# Altium schematic symbol library BARKO_SCHLIB.SchLib: 1064 symbols (part 1 of 11) (continued)
## C-10NF-0603_1 (continued)
CAP CER 10000PF 50V X5R 0603; Manufacturer: TDK; Manufacturer Part Number: CGA3E2X5R1H103M080AA; Tolerance: 20%; Material: Ceramic; Insulation Resistance: 100GR; .PCBCHK: USED; .Creator: M.OZKAN; Washability: OK; Stock 1: 10; Pricing 1: 1=0.1, 10=0.046, 100=0.0203, 500=0.0145, 1000=0.01139 (USD); Mount: Surface Mount; Case/Package: 0603; Weight: 7.1E-05oz; Case Code (Metric): 1608; Min Operating Temperature: -55°C; Max Operating Temperature: 85°C; Package Quantity: 4000; Packaging: Tape and Reel; Capacitance: 10nF; Dielectric: X5R; Termination: SMD/SMT; Voltage Rating (DC): 50V; Length: 0.063inch; Height: 0.8mm; Width: 0.031inch; Thickness: 0.035inch; Ratings: AEC-Q200; Voltage: 50V; Depth: 1.25mm; Radiation Hardening: No; Lead Free: Lead Free; ComponentLink1URL: http://www.samsungsem.com/kr/front/downloadcms.do?path=/kr/support/product-search/mlcc/__icsFiles/afieldfile/2014/11/05&fileName=C_CL21B103KBANNNL.pdf; ComponentLink1Description: http://www.samsungsem.com/kr/front/downloadcms.do?path=/kr/support/product-search/mlcc/__icsFiles/afieldfile/2014/11/05&fileName=C_CL21B103KBANNNL.pdf; ComponentLink2URL: https://www.verical.com/server-webapp/html/getDatasheet?partID=354069; ComponentLink2Description: https://www.verical.com/server-webapp/html/getDatasheet?partID=354069; Number of Pins: 2; Composition: Ceramic; REACH SVHC: No SVHC; Halogen Free: Halogen Free; ComponentLink3URL: http://www.yageo.com/documents/recent/UPY-GPHC_X7R_6.3V-to-50V_18.pdf; ComponentLink3Description: http://www.yageo.com/documents/recent/UPY-GPHC_X7R_6.3V-to-50V_18.pdf; ComponentLink4URL: http://www.yageo.com/documents/recent/UPY-GPHC_X7R_6.3V-to-50V_8.pdf; ComponentLink4Description: http://www.yageo.com/documents/recent/UPY-GPHC_X7R_6.3V-to-50V_8.pdf; ComponentLink5URL: http://www.farnell.com/datasheets/1784427.pdf; ComponentLink5Description: http://www.farnell.com/datasheets/1784427.pdf; ComponentLink6URL: http://www.farnell.com/datasheets/1489800.pdf; ComponentLink6Description: http://www.farnell.com/datasheets/1489800.pdf; ComponentLink7URL: http://www.farnell.com/datasheets/1734573.pdf; ComponentLink7Description: http://www.farnell.com/datasheets/1734573.pdf; .SCHCHK: USED; Stock 2: 0; Dielectric Material: Ceramic; ComponentLink8URL: http://psearch.murata.com/capacitor/product/GRM188R61H103KA01%23.pdf?src-supplier=Avnet; ComponentLink8Description: http://psearch.murata.com/capacitor/product/GRM188R61H103KA01%23.pdf?src-supplier=Avnet; ComponentLink9URL: http://psearch.murata.com/capacitor/product/GRM188R61H103KA01%23.pdf?src-supplier=Avnet+Europe; ComponentLink9Description: http://psearch.murata.com/capacitor/product/GRM188R61H103KA01%23.pdf?src-supplier=Avnet+Europe; ComponentLink10URL: http://search.murata.co.jp/Ceramy/image/img/A01X/partnumbering_e_01.pdf?src-supplier=Digi-Key; ComponentLink10Description: http://search.murata.co.jp/Ceramy/image/img/A01X/partnumbering_e_01.pdf?src-supplier=Digi-Key; Supplier 1: Digi-Key; Supplier Part Number 1: 445-12487-6-ND
footprint C-0603
pins: 1, 2

## C-10NF-0603_2
designator C?, comment 10NF  Voltage Rating: 50V  Case Code (Imperial): 0603
CAP CER 10000PF 50V X7R 0603; Manufacturer: Samsung; Manufacturer Part Number: CL10B103JB8NNNC; Material: Ceramic; Tolerance: 10%; Dielectric: X5R; Voltage: 10V; Dielectric Material: Tantalum; .PCBCHK: USED; .Creator: M.OZKAN; Washability: OK; Stock 1: 0; Pricing 1: 1=0.1, 10=0.058, 100=0.0259, 500=0.0185, 1000=0.01454 (USD); Mount: Surface Mount; Case/Package: 0603; Case Code (Metric): 1608; Contact Plating: Tin; Min Operating Temperature: -55°C; Max Operating Temperature: 125°C; Capacitance: 10nF; Packaging: Tape and Reel; Package Quantity: 1; Length: 1.6mm; Height: 0.8mm; Width: 0.031inch; Thickness: 0.035inch; Depth: 0.8mm; Radiation Hardening: No; ComponentLink1URL: http://www1.futureelectronics.com/doc/SAMSUNG%20PASSIVE/CL05B104KQ5NNNC.pdf; ComponentLink1Description: http://www1.futureelectronics.com/doc/SAMSUNG%20PASSIVE/CL05B104KQ5NNNC.pdf; ComponentLink2URL: https://www.verical.com/server-webapp/html/getDatasheet?partID=355180; ComponentLink2Description: https://www.verical.com/server-webapp/html/getDatasheet?partID=355180; ComponentLink3URL: https://www.distrelec.biz/Web/Downloads/_e/ng/MLCC_CatalogDownload2013_ENG.pdf?mime=application%2Fpdf; ComponentLink3Description: https://www.distrelec.biz/Web/Downloads/_e/ng/MLCC_CatalogDownload2013_ENG.pdf?mime=application%2Fpdf; ComponentLink4URL: https://produktinfo.conrad.com/datenblaetter/450000-474999/457411-da-01-en-VS_KONDENSATOR_0603.pdf; ComponentLink4Description: https://produktinfo.conrad.com/datenblaetter/450000-474999/457411-da-01-en-VS_KONDENSATOR_0603.pdf; Stock 2: 0; Pricing 2: 1=0.13, 10=0.095, 100=0.0422, 500=0.03012, 1000=0.02367 (USD); Number of Pins: 2; Voltage Rating (DC): 50V; Termination: SMD/SMT; Composition: Ceramic; REACH SVHC: No SVHC; Lead Free: Lead Free; Halogen Free: Halogen Free; ComponentLink5URL: https://www.verical.com/server-webapp/html/getDatasheet?partID=299871; ComponentLink5Description: https://www.verical.com/server-webapp/html/getDatasheet?partID=299871; ComponentLink6URL: http://www.farnell.com/datasheets/1489800.pdf; ComponentLink6Description: http://www.farnell.com/datasheets/1489800.pdf; ComponentLink7URL: http://www.yageo.com/documents/recent/UPY-GPHC_X7R_6.3V-to-50V_8.pdf; ComponentLink7Description: http://www.yageo.com/documents/recent/UPY-GPHC_X7R_6.3V-to-50V_8.pdf; Stock 3: 40000; Pricing 3: 1=0.12, 10=0.088, 100=0.0413, 500=0.02894, 1000=0.02396 (USD); ComponentLink8URL: http://www.mouser.com/ds/2/427/vjw1bcbascomseries-223529.pdf; ComponentLink8Description: http://www.mouser.com/ds/2/427/vjw1bcbascomseries-223529.pdf; ComponentLink9URL: http://www.vishay.com/docs/28548/vjw1bcbascomseries.pdf; ComponentLink9Description: http://www.vishay.com/docs/28548/vjw1bcbascomseries.pdf; .SCHCHK: USED; Supplier 1: Digi-Key; Supplier Part Number 1: 1276-1103-6-ND
footprint C-0603
pins: 1, 2

## C-10NF-0805
designator C?, comment 10NF  Case/Package: 0805  Voltage Rating: 50V
CAP CER 10000PF 50V X7R 0805; Manufacturer: Samsung; Manufacturer Part Number: CL21B103KBANNNC; Material: Ceramic; Tolerance: 10%; Insulation Resistance: 100GR; Dissipation Factor: 2.5%; .PCBCHK: USED; .Creator: M.OZKAN; Washability: OK; Stock 1: 0; Pricing 1: 1=0.1, 10=0.043, 100=0.0191, 500=0.01366, 1000=0.01073 (USD); Mount: Surface Mount; Case Code (Metric): 2012; Case Code (Imperial): 0805; Contact Plating: Tin; Min Operating Temperature: -55°C; Max Operating Temperature: 125°C; Voltage Rating (DC): 50V; Capacitance: 10nF; Packaging: Tape and Reel; Dielectric: X7R; Voltage: 50V; Length: 2mm; Height: 0.65mm; Width: 0.049inch; Thickness: 0.03inch; Depth: 1.25mm; Radiation Hardening: No; Lead Free: Lead Free; ComponentLink1URL: https://media.digikey.com/pdf/Data%20Sheets/Samsung%20PDFs/CL_Series_MLCC_ds.pdf; ComponentLink1Description: https://media.digikey.com/pdf/Data%20Sheets/Samsung%20PDFs/CL_Series_MLCC_ds.pdf; ComponentLink2URL: https://www.verical.com/server-webapp/html/getDatasheet?partID=358359; ComponentLink2Description: https://www.verical.com/server-webapp/html/getDatasheet?partID=358359; ComponentLink3URL: http://www1.futureelectronics.com/doc/SAMSUNG%20PASSIVE/CL05B104KQ5NNNC.pdf; ComponentLink3Description: http://www1.futureelectronics.com/doc/SAMSUNG%20PASSIVE/CL05B104KQ5NNNC.pdf; ComponentLink4URL: https://www.distrelec.biz/Web/Downloads/_e/ng/MLCC_CatalogDownload2013_ENG.pdf?mime=application%2Fpdf; ComponentLink4Description: https://www.distrelec.biz/Web/Downloads/_e/ng/MLCC_CatalogDownload2013_ENG.pdf?mime=application%2Fpdf; ComponentLink5URL: https://produktinfo.conrad.com/datenblaetter/450000-474999/455082-da-01-en-VS_KONDENSATOR_0805.pdf; ComponentLink5Description: https://produktinfo.conrad.com/datenblaetter/450000-474999/455082-da-01-en-VS_KONDENSATOR_0805.pdf; Stock 2: 40000; Pricing 2: 1=0.14, 10=0.1, 100=0.0468, 500=0.03284, 1000=0.02718 (USD); Number of Pins: 2; Package Quantity: 1; Termination: SMD/SMT; Composition: Ceramic; REACH SVHC: No SVHC; Halogen Free: Halogen Free; ComponentLink6URL: http://www.yageo.com/documents/recent/UPY-GPHC_X7R_6.3V-to-50V_18.pdf; ComponentLink6Description: http://www.yageo.com/documents/recent/UPY-GPHC_X7R_6.3V-to-50V_18.pdf; ComponentLink7URL: http://www.yageo.com/documents/recent/UPY-GPHC_X7R_6.3V-to-50V_8.pdf; ComponentLink7Description: http://www.yageo.com/documents/recent/UPY-GPHC_X7R_6.3V-to-50V_8.pdf; ComponentLink8URL: http://www.farnell.com/datasheets/1784427.pdf; ComponentLink8Description: http://www.farnell.com/datasheets/1784427.pdf; ComponentLink9URL: http://www.farnell.com/datasheets/1489800.pdf; ComponentLink9Description: http://www.farnell.com/datasheets/1489800.pdf; ComponentLink10URL: http://www.farnell.com/datasheets/1734573.pdf; ComponentLink10Description: http://www.farnell.com/datasheets/1734573.pdf; Stock 3: 40000; Pricing 3: 1=0.15, 10=0.106, 100=0.05, 500=0.03508, 1000=0.02904 (USD); Dielectric Material: Ceramic; ComponentLink11URL: http://catalogs.avx.com/SurfaceMount.pdf; ComponentLink11Description: http://catalogs.avx.com/SurfaceMount.pdf; ComponentLink12URL: http://avx.com/docs/Catalogs/cx7r.pdf; ComponentLink12Description: http://avx.com/docs/Catalogs/cx7r.pdf; ComponentLink13URL: http://www.farnell.com/datasheets/1679506.pdf; ComponentLink13Description: http://www.farnell.com/datasheets/1679506.pdf; ComponentLink14URL: http://www.alliedelec.com/m/d/a24bb5190bea413b2ff164816f55e87c.pdf; ComponentLink14Description: http://www.alliedelec.com/m/d/a24bb5190bea413b2ff164816f55e87c.pdf; ComponentLink15URL: http://www.jameco.com/Jameco/Products/ProdDS/2009421.pdf; ComponentLink15Description: http://www.jameco.com/Jameco/Products/ProdDS/2009421.pdf; ComponentLink16URL: http://www.avx.com/docs/catalogs/cx7r.pdf; ComponentLink16Description: http://www.avx.com/docs/catalogs/cx7r.pdf; ComponentLink17URL: http://www.mouser.com/ds/2/40/X7RDielectric-777024.pdf; ComponentLink17Description: http://www.mouser.com/ds/2/40/X7RDielectric-777024.pdf; ComponentLink18URL: http://uk.rs-online.com/webdocs/13cc/0900766b813cc99e.pdf; ComponentLink18Description: http://uk.rs-online.com/webdocs/13cc/0900766b813cc99e.pdf; .SCHCHK: USED; Supplier 1: Digi-Key; Supplier Part Number 1: 1276-1015-6-ND
footprint C-0805
pins: 1, 2

## C-10NF-1210
designator C?, comment 10NF  Voltage Rating: 1.5kV  Case Code (Imperial): 1210
CAP CER 10000PF 1.5KV X7R 1210; Manufacturer: KEMET; Manufacturer Part Number: C1210C103KFRAC7800; Dielectric Material: Ceramic; Tolerance: 10%; .Creator: M.OZKAN; .PCBCHK: USED; Washability: OK; Supplier 1: Digi-Key; Stock 1: 2842; Pricing 1: 1=1.42, 10=1.123, 100=0.8425, 500=0.63654, 1000=0.56166 (USD); Mount: Surface Mount; Case/Package: 1210; Case Code (Metric): 3225; Min Operating Temperature: -55°C; Max Operating Temperature: 125°C; Packaging: Tape and Reel; Dielectric: X7R; Voltage Rating (DC): 1.5kV; Length: 0.126inch; Width: 0.098inch; Depth: 2.5mm; Thickness: 0.061inch; Capacitance: 10nF; Supplier Part Number 1: 399-13305-6-ND; .SCHCHK: USED
footprint C-1210
pins: 1, 2

## C-10PF-0402
designator C?, comment 10PF  Case/Package: 0402
CAP CER 10PF 50V C0G/NP0 0402; Manufacturer: Murata; Manufacturer Part Number: GRM1555C1H100FA01D; Tolerance: 1%; Dielectric: C0G; Washability: OK; .Creator: M.OZKAN; .PCBCHK: USED; Supplier 1: Digi-Key; Stock 1: 1088544; Pricing 1: 1=0,10000, 10=0,05600, 100=0,02480, 500=0,01772, 1000=0,01392, 2500=0,01265, 5000=0,01164 (USD); RoHS: Yes; Mount: Surface Mount; Case Code (Metric): 1005; Case Code (Imperial): 0402; Min Operating Temperature: -55°C; Max Operating Temperature: 125°C; Capacitance: 10pF; Voltage Rating: 50V; Voltage Rating (DC): 50V; Packaging: Tape and Reel; Package Quantity: 10000; Termination: SMD/SMT; Length: 1mm; Height: 0.5mm; Width: 0.02inch; Thickness: 0.022inch; Depth: 0.5mm; Radiation Hardening: No; REACH SVHC: No SVHC; Lead Free: Lead Free; ComponentLink1URL: https://datasheet.ciiva.com/6263/partnumbering-e-01-6263819.pdf?src-supplier=Digi-Key; ComponentLink1Description: https://datasheet.ciiva.com/6263/partnumbering-e-01-6263819.pdf?src-supplier=Digi-Key; ComponentLink2URL: https://datasheet.ciiva.com/6263/partnumbering-e-01-6263822.pdf?src-supplier=Digi-Key; ComponentLink2Description: https://datasheet.ciiva.com/6263/partnumbering-e-01-6263822.pdf?src-supplier=Digi-Key; Supplier Part Number 1: 490-6186-1-ND; .SCHCHK: USED
footprint C-0402
pins: 1, 2

## C-10PF-0603
designator C?, comment 10PF  Voltage Rating: 50V  Case/Package: 0603
CAP CER 0603 10PF 50V X7R 10% AU; Manufacturer: KEMET; Manufacturer Part Number: C0603C100K5RACAUTO; Dielectric Material: Ceramic; .PCBCHK: USED; .Creator: M.OZKAN; Washability: OK; Stock 1: 0; Pricing 1: 1=0.34, 10=0.236, 100=0.1337, 500=0.0944, 1000=0.08261 (USD); Voltage Rating (DC): 50V; Dielectric: X7R; Tolerance: 10%; Capacitance: 10pF; Stock 2: 1180; Pricing 2: 1=0.28, 10=0.194, 100=0.0983, 500=0.06728, 1000=0.05951 (USD); Mount: Surface Mount; Number of Pins: 2; Case Code (Metric): 1608; Min Operating Temperature: -55°C; Max Operating Temperature: 125°C; Packaging: Tape and Reel; Package Quantity: 4000; Termination: SMD/SMT; Length: 1.6mm; Width: 0.032inch; Thickness: 0.035inch; Depth: 0.81mm; Radiation Hardening: No; REACH SVHC: Unknown; Lead Free: Lead Free; ComponentLink1URL: http://datasheets.avx.com/X7RDielectric.pdf; ComponentLink1Description: http://datasheets.avx.com/X7RDielectric.pdf; ComponentLink2URL: http://www.farnell.com/datasheets/1679506.pdf; ComponentLink2Description: http://www.farnell.com/datasheets/1679506.pdf; ComponentLink3URL: http://www.avx.com/docs/Catalogs/cx7r.pdf; ComponentLink3Description: http://www.avx.com/docs/Catalogs/cx7r.pdf; ComponentLink4URL: http://www.mouser.com/ds/2/40/X7RDielectric-777024.pdf; ComponentLink4Description: http://www.mouser.com/ds/2/40/X7RDielectric-777024.pdf; ComponentLink5URL: https://www.verical.com/server-webapp/html/getDatasheet?partID=317346; ComponentLink5Description: https://www.verical.com/server-webapp/html/getDatasheet?partID=317346; Stock 3: 3791; Pricing 3: 1=0.31, 10=0.216, 100=0.1222, 500=0.08626, 1000=0.07547 (USD); ComponentLink6URL: http://datasheet.octopart.com/C0603C100K5RACTU-KEMET-datasheet-86780145.pdf; ComponentLink6Description: http://datasheet.octopart.com/C0603C100K5RACTU-KEMET-datasheet-86780145.pdf; ComponentLink7URL: http://datasheet.octopart.com/C0603C100K5RACTU-KEMET-datasheet-84169754.pdf; ComponentLink7Description: http://datasheet.octopart.com/C0603C100K5RACTU-KEMET-datasheet-84169754.pdf; Case Code (Imperial): 0603; .SCHCHK: USED; Supplier 1: Digi-Key; Supplier Part Number 1: 399-13711-6-ND
footprint C-0603
pins: 1, 2

## C-10UF-0402
designator C?, comment 10UF  Voltage Rating: 10V  Case Code (Imperial): 0402
CAP CER 10UF 10V X5R 0402; Manufacturer: Samsung; Manufacturer Part Number: CL05A106MP8NUB8; Tolerance: 20%; Washability: OK; .Creator: M.OZKAN; .PCBCHK: USED; Supplier 1: Digi-Key; Stock 1: 626854; Pricing 1: 1=0.47000, 10=0.32300, 100=0.19410, 500=0.14556, 1000=0.12291, 2500=0.11644 (USD); RoHS: Yes; Mount: Surface Mount; Case/Package: 0402; Case Code (Metric): 1005; Min Operating Temperature: -55°C; Max Operating Temperature: 85°C; Packaging: Tape and Reel; Capacitance: 10uF; Length: 0.039inch; Width: 0.02inch; Thickness: 0.035inch; ComponentLink1URL: http://www.samsungsem.com/kr/support/product-search/mlcc/CL05A106MP8NUB8.jsp?src-supplier=Digi-Key; ComponentLink1Description: http://www.samsungsem.com/kr/support/product-search/mlcc/CL05A106MP8NUB8.jsp?src-supplier=Digi-Key; Supplier Part Number 1: 1276-6830-1-ND; .SCHCHK: USED
footprint C-0402
pins: 1, 2

## C-10UF-0603
designator C?, comment 10UF  Voltage Rating: 16V  Case/Package: 0603
CAP CER 10UF 16V X6S 0603; Manufacturer: Murata; Manufacturer Part Number: GRM188C81C106MA73D; Material: Ceramic; Tolerance: 20%; .PCBCHK: USED; .Creator: M.OZKAN; Washability: OK; Stock 1: 0; Pricing 1: 1=0.53, 10=0.366, 100=0.2195, 500=0.16464, 1000=0.13903 (USD); Mount: Surface Mount; Weight: 0.000222oz; Case Code (Metric): 1608; Case Code (Imperial): 0603; Min Operating Temperature: -55°C; Max Operating Temperature: 105°C; Package Quantity: 4000; Packaging: Tape and Reel; Capacitance: 10uF; Dielectric: X6S; Voltage: 16V; Termination: SMD/SMT; Composition: Ceramic; Voltage Rating (DC): 16V; Length: 1.6mm; Height: 0.8mm; Width: 0.8mm; Thickness: 0.031inch; Depth: 0.8mm; REACH SVHC: No SVHC; Lead Free: Lead Free; ComponentLink1URL: https://www.murata.com/~/media/webrenewal/support/library/catalog/products/capacitor/mlcc/c02e.ashx?la=en-us; ComponentLink1Description: https://www.murata.com/~/media/webrenewal/support/library/catalog/products/capacitor/mlcc/c02e.ashx?la=en-us; Stock 2: 1927; Pricing 2: 1=0.3, 10=0.205, 100=0.1159, 500=0.08184, 1000=0.07161 (USD); .SCHCHK: USED; Supplier 1: Digi-Key; Supplier Part Number 1: 1276-6769-6-ND
footprint C-0603
pins: 1, 2

## C-10UF-0603_1
designator C?, comment 10UF  Voltage Rating: 25V  Case Code (Imperial): 0603
CAP CER 10UF 25V X5R 0603; Manufacturer: Murata; Manufacturer Part Number: GRT188R61E106ME13D; Tolerance: 20%; .PCBCHK: USED; .Creator: M.OZKAN; Washability: OK; Stock 1: 0; Pricing 1: 1=0.53, 10=0.377, 100=0.2484, 500=0.18398, 1000=0.15639 (USD); Mount: Surface Mount; Case/Package: 0603; Min Operating Temperature: -55°C; Max Operating Temperature: 85°C; Packaging: Tape and Reel; Capacitance: 10uF; Length: 0.063inch; Width: 0.031inch; Thickness: 0.035inch; Ratings: AEC-Q200; Stock 2: 30000; Pricing 2: 1=0.63, 10=0.446, 100=0.2934, 500=0.21736, 1000=0.18475 (USD); Voltage: 25V; Dielectric: X5R; Voltage Rating (DC): 25V; Height: 1mm; Depth: 0.8mm; REACH SVHC: No SVHC; Stock 3: 0; Pricing 3: 1=0.58, 10=0.4, 100=0.2398, 500=0.17984, 1000=0.15186 (USD); Lead Free: Lead Free; Case Code (Metric): 1608; .SCHCHK: USED; Supplier 1: Digi-Key; Supplier Part Number 1: 490-12323-6-ND
footprint C-0603
pins: 1, 2

## C-10UF-0805
designator C?, comment 10UF  Voltage: 16V  Case Code (Imperial): 0805
CAP CER 10UF 16V X7R 0805; Manufacturer: Samsung; Manufacturer Part Number: CL21B106KOQNNNE; Tolerance: 10%; Material: Ceramic; .PCBCHK: USED; .Creator: M.OZKAN; Washability: OK; Stock 1: 0; Pricing 1: 1=0.3, 10=0.207, 100=0.1173, 500=0.0828, 1000=0.07245 (USD); Mount: Surface Mount; Case/Package: 0805; Case Code (Metric): 2012; Contact Plating: Tin; Min Operating Temperature: -55°C; Max Operating Temperature: 125°C; Packaging: Tape and Reel; Capacitance: 10uF; Voltage Rating: 16V; Package Quantity: 1; Dielectric: X7R; Length: 2mm; Height: 1.25mm; Width: 0.049inch; Thickness: 0.055inch; Depth: 1.25mm; Radiation Hardening: No; ComponentLink1URL: http://www1.futureelectronics.com/doc/SAMSUNG/CL21B106KOQNNNE.pdf; ComponentLink1Description: http://www1.futureelectronics.com/doc/SAMSUNG/CL21B106KOQNNNE.pdf; ComponentLink2URL: https://media.digikey.com/pdf/Data%20Sheets/Samsung%20PDFs/CL_Series_MLCC_ds.pdf; ComponentLink2Description: https://media.digikey.com/pdf/Data%20Sheets/Samsung%20PDFs/CL_Series_MLCC_ds.pdf; ComponentLink3URL: https://www.verical.com/server-webapp/html/getDatasheet?partID=355170; ComponentLink3Description: https://www.verical.com/server-webapp/html/getDatasheet?partID=355170; Stock 2: 0; Pricing 2: 1=0.3, 10=0.207, 100=0.1173, 500=0.0828, 1000=0.07245 (USD); Lead Free: Lead Free; ComponentLink4URL: http://www.samsungsem.com/kr/support/product-search/mlcc/CL21B106KOQNNNG.jsp; ComponentLink4Description: http://www.samsungsem.com/kr/support/product-search/mlcc/CL21B106KOQNNNG.jsp; ComponentLink5URL: https://produktinfo.conrad.com/datenblaetter/450000-474999/454918-da-01-en-VS_KONDENSATOR_0805.pdf; ComponentLink5Description: https://produktinfo.conrad.com/datenblaetter/450000-474999/454918-da-01-en-VS_KONDENSATOR_0805.pdf; .SCHCHK: USED; Supplier 1: Digi-Key; Supplier Part Number 1: 1276-2872-6-ND
footprint C-0805
pins: 1, 2

## C-10UF-1206
designator C?, comment 10UF  Voltage: 25V  Case/Package: 1206
CAP CER 10UF 25V X7R 1206; Manufacturer: Samsung; Manufacturer Part Number: CL31B106KAHNNNE; Tolerance: 10%; Dielectric Material: Ceramic; .PCBCHK: USED; .Creator: M.OZKAN; Washability: OK; Stock 1: 0; Pricing 1: 1=0.34, 10=0.234, 100=0.1183, 500=0.08096, 1000=0.07162 (USD); Mount: Surface Mount; Case Code (Metric): 3216; Case Code (Imperial): 1206; Min Operating Temperature: -55°C; Max Operating Temperature: 125°C; Capacitance: 10uF; Packaging: Tape and Reel; Voltage Rating: 25V; Package Quantity: 1; Dielectric: X7R; Length: 3.2mm; Height: 1.6mm; Width: 0.063inch; Thickness: 0.071inch; Depth: 1.6mm; Radiation Hardening: No; ComponentLink1URL: https://www.verical.com/server-webapp/html/getDatasheet?partID=356415; ComponentLink1Description: https://www.verical.com/server-webapp/html/getDatasheet?partID=356415; ComponentLink2URL: http://www1.futureelectronics.com/doc/SAMSUNG/CL03A105MQ3CSNC.pdf; ComponentLink2Description: http://www1.futureelectronics.com/doc/SAMSUNG/CL03A105MQ3CSNC.pdf; ComponentLink3URL: https://media.digikey.com/pdf/Data%20Sheets/Samsung%20PDFs/CL_Series_MLCC_ds.pdf; ComponentLink3Description: https://media.digikey.com/pdf/Data%20Sheets/Samsung%20PDFs/CL_Series_MLCC_ds.pdf; Stock 2: 20000; Pricing 2: 1=0.83, 10=0.589, 100=0.3881, 500=0.2875, 1000=0.24438 (USD); Number of Pins: 2; Weight: 0.000571oz; Voltage Rating (DC): 25V; Termination: SMD/SMT; Composition: Ceramic; Lead Free: Lead Free; REACH SVHC: No SVHC; ComponentLink4URL: http://www.tdk.com/pdf/general_B11.pdf; ComponentLink4Description: http://www.tdk.com/pdf/general_B11.pdf; ComponentLink5URL: http://www.tdk.co.jp/tefe02/e412_c.pdf; ComponentLink5Description: http://www.tdk.co.jp/tefe02/e412_c.pdf; ComponentLink6URL: https://product.tdk.com/info/en/documents/chara_sheet/C3216X7R1E106K160AB.pdf; ComponentLink6Description: https://product.tdk.com/info/en/documents/chara_sheet/C3216X7R1E106K160AB.pdf; ComponentLink7URL: http://www.mouser.com/ds/2/400/lcc_commercial_general_en-560200.pdf; ComponentLink7Description: http://www.mouser.com/ds/2/400/lcc_commercial_general_en-560200.pdf; ComponentLink8URL: https://www.verical.com/server-webapp/html/getDatasheet?partID=732731; ComponentLink8Description: https://www.verical.com/server-webapp/html/getDatasheet?partID=732731; Stock 3: 25000; Pricing 3: 1=1, 10=0.758, 100=0.5421, 500=0.4197, 1000=0.3614 (USD); Contact Plating: Matte,Tin; ComponentLink9URL: http://avx.com/docs/Catalogs/cx7r.pdf; ComponentLink9Description: http://avx.com/docs/Catalogs/cx7r.pdf; ComponentLink10URL: http://www.mouser.com/ds/2/40/X7RDielectric-777024.pdf; ComponentLink10Description: http://www.mouser.com/ds/2/40/X7RDielectric-777024.pdf; ComponentLink11URL: http://www.avx.com/docs/catalogs/cx7r.pdf; ComponentLink11Description: http://www.avx.com/docs/catalogs/cx7r.pdf; .SCHCHK: USED; Supplier 1: Digi-Key; Supplier Part Number 1: 478-9944-6-ND
footprint C-1206
pins: 1, 2

## C-10UF-1206 TANT
designator C?, comment 10UF  Voltage Rating: 16V  Case Code (Imperial): 1206
CAP TANT 10UF 16V 10% 1206; Manufacturer: Kyocera AVX; Manufacturer Part Number: F931C106KAA; Dielectric Material: Tantalum; ESR (Equivalent Series Resistance): 7R; Polarity: Polar; Ripple Current: 104mA; Leakage Current: 1.6uA; Life (Hours): 2000Hour; .PCBCHK: USED; .Creator: M.OZKAN; Washability: OK; Stock 1: 753363; Pricing 1: 1=0.48, 10=0.342, 100=0.225, 500=0.16664, 1000=0.14164 (USD); Stock 2: 432861; Pricing 2: 1=0.45, 10=0.312, 100=0.1873, 500=0.14048, 1000=0.11862 (USD); Mount: PCB,Surface Mount; Case/Package: 1206; Number of Pins: 2; Case Code (Metric): 3216; Min Operating Temperature: -55°C; Max Operating Temperature: 125°C; Capacitance: 10uF; Tolerance: 10%; Packaging: Tape and Reel; Dissipation Factor: 10%; Voltage Rating (DC): 16V; Package Quantity: 1; Failure Rate: 0.001%; Termination: SMD/SMT; Voltage: 16V; Features: General Purpose; Length: 3.2mm; Height: 1.6mm; Width: 1.6mm; Depth: 1.6mm; Height - Seated (Max): 0.071inch; Lead Pitch: 1.2mm; Radiation Hardening: No; Lead Free: Lead Free; REACH SVHC: No SVHC; ComponentLink1URL: http://www.farnell.com/datasheets/1854511.pdf; ComponentLink1Description: http://www.farnell.com/datasheets/1854511.pdf; ComponentLink2URL: http://www.farnell.com/datasheets/2119995.pdf; ComponentLink2Description: http://www.farnell.com/datasheets/2119995.pdf; ComponentLink3URL: https://www.alliedelec.com/m/d/1172a60f7bb3eb66344f86e8fb9ddbde.pdf; ComponentLink3Description: https://www.alliedelec.com/m/d/1172a60f7bb3eb66344f86e8fb9ddbde.pdf; ComponentLink4URL: https://api.kemet.com/component-edge/download/datasheet/T491A106K016AT.pdf; ComponentLink4Description: https://api.kemet.com/component-edge/download/datasheet/T491A106K016AT.pdf; ComponentLink5URL: http://www.farnell.com/datasheets/1446014.pdf; ComponentLink5Description: http://www.farnell.com/datasheets/1446014.pdf; ComponentLink6URL: http://www.jameco.com/Jameco/Products/ProdDS/1573257.pdf; ComponentLink6Description: http://www.jameco.com/Jameco/Products/ProdDS/1573257.pdf; ComponentLink7URL: http://www.mouser.com/ds/2/212/KEM_T2005_T491-1093550.pdf; ComponentLink7Description: http://www.mouser.com/ds/2/212/KEM_T2005_T491-1093550.pdf; ComponentLink8URL: https://www.distrelec.biz/Web/Downloads/_t/ds/KEM_T2005_T491_eng_tds.pdf?mime=application%2Fpdf; ComponentLink8Description: https://www.distrelec.biz/Web/Downloads/_t/ds/KEM_T2005_T491_eng_tds.pdf?mime=application%2Fpdf; ComponentLink9URL: http://www.onlinecomponents.com/productFiles/mf-KEM/kem_t2005_t491.pdf; ComponentLink9Description: http://www.onlinecomponents.com/productFiles/mf-KEM/kem_t2005_t491.pdf; ComponentLink10URL: http://www.farnell.com/datasheets/1923792.pdf; ComponentLink10Description: http://www.farnell.com/datasheets/1923792.pdf; ComponentLink11URL: https://produktinfo.conrad.com/datenblaetter/450000-474999/458306-da-01-de-KONDENSATOR_10UF_3216_10Pr_16V_85C.pdf; ComponentLink11Description: https://produktinfo.conrad.com/datenblaetter/450000-474999/458306-da-01-de-KONDENSATOR_10UF_3216_10Pr_16V_85C.pdf; Stock 3: 57774; Pricing 3: 1=0.49, 10=0.338, 100=0.2029, 500=0.15214, 1000=0.12848, 2500=0.12172 (USD); ComponentLink12URL: http://datasheets.avx.com/TAJ.pdf; ComponentLink12Description: http://datasheets.avx.com/TAJ.pdf; ComponentLink13URL: http://www.mouser.com/ds/2/40/taj-776811.pdf; ComponentLink13Description: http://www.mouser.com/ds/2/40/taj-776811.pdf; ComponentLink14URL: http://www.avx.com/docs/catalogs/taj.pdf; ComponentLink14Description: http://www.avx.com/docs/catalogs/taj.pdf; .SCHCHK: USED; Supplier 1: Digi-Key; Supplier Part Number 1: 478-8235-6-ND
footprint C-TANTA-3216
pins: 1, 2
text: +

## C-10UF-1206_1
designator C?, comment 10UF  Voltage Rating: 35V  Case/Package: 1206
CAP CER 10UF 35V X7R 1206; Manufacturer: Taiyo Yuden; Manufacturer Part Number: GMK316AB7106KL-TR; Tolerance: 10%; Dielectric Material: Ceramic; .PCBCHK: USED; .Creator: M.OZKAN; Washability: OK; Stock 1: 2000; Pricing 1: 1=0.61, 10=0.431, 100=0.2841, 500=0.21046, 1000=0.17888 (USD); Mount: Surface Mount; Case Code (Imperial): 1206; Case Code (Metric): 3216; Min Operating Temperature: -55°C; Max Operating Temperature: 125°C; Capacitance: 10uF; Package Quantity: 2000; Voltage Rating (DC): 35V; Packaging: Tape and Reel; Dielectric: X7R; Termination: SMD/SMT; Composition: Ceramic; Length: 0.126inch; Height: 1.6mm; Width: 1.6mm; Thickness: 0.071inch; REACH SVHC: No SVHC; ComponentLink1URL: http://www.farnell.com/datasheets/1497285.pdf; ComponentLink1Description: http://www.farnell.com/datasheets/1497285.pdf; ComponentLink2URL: https://media.digikey.com/pdf/Data%20Sheets/Taiyo%20Yuden%20PDFs%20URL%20links/GMK316AB7106KL-TR_ProdSpec.pdf; ComponentLink2Description: https://media.digikey.com/pdf/Data%20Sheets/Taiyo%20Yuden%20PDFs%20URL%20links/GMK316AB7106KL-TR_ProdSpec.pdf; Stock 2: 0; Pricing 2: 1=0.92, 10=0.648, 100=0.4269, 500=0.31626, 1000=0.26881 (USD); Weight: 0.000571oz; Lead Free: Lead Free; ComponentLink3URL: https://product.tdk.com/info/en/documents/chara_sheet/C3216X7R1V106K160AC.pdf; ComponentLink3Description: https://product.tdk.com/info/en/documents/chara_sheet/C3216X7R1V106K160AC.pdf; Stock 3: 0; Pricing 3: 1=0.84, 10=0.622, 100=0.4264, 500=0.33758, 1000=0.28428 (USD); Material: Ceramic; Contact Plating: Tin; Voltage: 35V; Depth: 1.6mm; Radiation Hardening: No; ComponentLink4URL: https://media.digikey.com/pdf/Data%20Sheets/Samsung%20PDFs/CL_Series_MLCC_ds.pdf; ComponentLink4Description: https://media.digikey.com/pdf/Data%20Sheets/Samsung%20PDFs/CL_Series_MLCC_ds.pdf; ComponentLink5URL: https://www.verical.com/server-webapp/html/getDatasheet?partID=354106; ComponentLink5Description: https://www.verical.com/server-webapp/html/getDatasheet?partID=354106; ComponentLink6URL: https://produktinfo.conrad.com/datenblaetter/450000-474999/452506-da-01-en-VS_KONDENSATOR_1206.pdf; ComponentLink6Description: https://produktinfo.conrad.com/datenblaetter/450000-474999/452506-da-01-en-VS_KONDENSATOR_1206.pdf; .SCHCHK: USED; Supplier 1: Digi-Key; Supplier Part Number 1: 587-3007-1-ND
footprint C-1206
pins: 1, 2

## C-10UF-1206_2
designator C?, comment 10UF  Voltage Rating: 50V  Case/Package: 1206
CAP CER 10UF 50V X5R 1206; Manufacturer: Samsung; Manufacturer Part Number: CL31A106KBHNNNE; Material: Ceramic; Tolerance: 10%; .PCBCHK: USED; .Creator: M.OZKAN; Washability: OK; Stock 1: 0; Pricing 1: 1=0.67, 10=0.477, 100=0.3142, 500=0.23276, 1000=0.19784 (USD); Mount: Surface Mount; Contact Plating: Tin; Min Operating Temperature: -55°C; Max Operating Temperature: 85°C; Capacitance: 10uF; Dielectric: X5R; Package Quantity: 1; Packaging: Tape and Reel; Voltage Rating (DC): 50V; Length: 3.2mm; Height: 1.6mm; Width: 0.063inch; Thickness: 0.071inch; Depth: 1.6mm; Radiation Hardening: No; Lead Free: Lead Free; ComponentLink1URL: https://media.digikey.com/pdf/Data%20Sheets/Samsung%20PDFs/CL_Series_MLCC_ds.pdf; ComponentLink1Description: https://media.digikey.com/pdf/Data%20Sheets/Samsung%20PDFs/CL_Series_MLCC_ds.pdf; ComponentLink2URL: http://www1.futureelectronics.com/doc/SAMSUNG%20PASSIVE/CL05B104KQ5NNNC.pdf; ComponentLink2Description: http://www1.futureelectronics.com/doc/SAMSUNG%20PASSIVE/CL05B104KQ5NNNC.pdf; ComponentLink3URL: http://www.rapidonline.com/pdf/71-0881.pdf; ComponentLink3Description: http://www.rapidonline.com/pdf/71-0881.pdf; ComponentLink4URL: https://www.verical.com/server-webapp/html/getDatasheet?partID=353196; ComponentLink4Description: https://www.verical.com/server-webapp/html/getDatasheet?partID=353196; ComponentLink5URL: https://produktinfo.conrad.com/datenblaetter/450000-474999/452492-da-01-en-VS_KONDENSATOR_1206.pdf; ComponentLink5Description: https://produktinfo.conrad.com/datenblaetter/450000-474999/452492-da-01-en-VS_KONDENSATOR_1206.pdf; Case Code (Imperial): 1206; Case Code (Metric): 3216; Stock 2: 13821; Pricing 2: 1=1.06, 10=0.807, 100=0.5775, 500=0.44712, 1000=0.38502 (USD); Weight: 0.000571oz; Termination: SMD/SMT; Composition: Ceramic; Ratings: AEC-Q200; REACH SVHC: No SVHC; ComponentLink6URL: http://www.mouser.com/ds/2/400/lcc_automotive_general_en-843974.pdf; ComponentLink6Description: http://www.mouser.com/ds/2/400/lcc_automotive_general_en-843974.pdf; ComponentLink7URL: http://product.tdk.com/capacitor/mlcc/en/documents/mlcc_automotive_general_en.pdf; ComponentLink7Description: http://product.tdk.com/capacitor/mlcc/en/documents/mlcc_automotive_general_en.pdf; Stock 3: 0; Pricing 3: 1=0.75, 10=0.53, 100=0.3493, 500=0.25876, 1000=0.21994 (USD); .SCHCHK: USED; Supplier 1: Digi-Key; Supplier Part Number 1: 1276-2876-6-ND
footprint C-1206
pins: 1, 2

## C-10UF-1210
designator C?, comment 10UF  Voltage Rating: 50V  Case/Package: 1210
CAP CER 10UF 50V X7R 1210; Manufacturer: Samsung; Manufacturer Part Number: CL32B106KBJNNNE; Material: Ceramic; Tolerance: 10%; .PCBCHK: USED; .Creator: M.OZKAN; Washability: OK; Stock 1: 0; Pricing 1: 1=0.96, 10=0.704, 100=0.483, 500=0.38238 (USD); Mount: Surface Mount; Case Code (Metric): 3225; Case Code (Imperial): 1210; Min Operating Temperature: -55°C; Max Operating Temperature: 125°C; Packaging: Tape and Reel; Package Quantity: 1; Capacitance: 10uF; Dielectric: X7R; Voltage: 50V; Voltage Rating (DC): 50V; Length: 3.2mm; Height: 2.5mm; Width: 0.098inch; Thickness: 0.106inch; Depth: 2.5mm; Radiation Hardening: No; Lead Free: Lead Free; ComponentLink1URL: http://www.samsungsem.com/kr/support/product-search/mlcc/CL32B106KBJNNNE .jsp; ComponentLink1Description: http://www.samsungsem.com/kr/support/product-search/mlcc/CL32B106KBJNNNE .jsp; ComponentLink2URL: https://produktinfo.conrad.com/datenblaetter/450000-474999/450821-da-01-en-VS_KONDENSATOR_1210.pdf; ComponentLink2Description: https://produktinfo.conrad.com/datenblaetter/450000-474999/450821-da-01-en-VS_KONDENSATOR_1210.pdf; Stock 2: 0; Pricing 2: 1=1.02, 10=0.755, 100=0.5175 (USD); Termination: SMD/SMT; Halogen Free: Halogen Free; ComponentLink3URL: https://www.yuden.co.jp/productdata/catalog/mlcc_all_e.pdf; ComponentLink3Description: https://www.yuden.co.jp/productdata/catalog/mlcc_all_e.pdf; Stock 3: 0; Pricing 3: 1=0.86, 10=0.61, 100=0.4017, 500=0.29756 (USD); ComponentLink4URL: http://www.samsungsem.com/kr/support/product-search/mlcc/CL32B106KBJNNWE.jsp; ComponentLink4Description: http://www.samsungsem.com/kr/support/product-search/mlcc/CL32B106KBJNNWE.jsp; .SCHCHK: USED; Supplier 1: Digi-Key; Supplier Part Number 1: 1276-3387-6-ND
footprint C-1210
pins: 1, 2

## C-10UF-1210_1
designator C?, comment 10UF  Voltage Rating: 50V  Case/Package: 1210
CAP CER 10UF 50V X7S 1210; Manufacturer: TDK; Manufacturer Part Number: C3225X7S1H106M250AB; Dielectric Material: Ceramic; Tolerance: 20%; .PCBCHK: USED; .Creator: M.OZKAN; Washability: OK; ComponentLink1URL: http://www.yuden.co.jp/ut/product/category/capacitor/UMK325AB7106MM-T.pdf; ComponentLink1Description: http://www.yuden.co.jp/ut/product/category/capacitor/UMK325AB7106MM-T.pdf; ComponentLink2URL: http://www.onlinecomponents.com/productFiles/mf-TAI/71umk325ab7106mm-t.pdf; ComponentLink2Description: http://www.onlinecomponents.com/productFiles/mf-TAI/71umk325ab7106mm-t.pdf; Stock 1: 0; Pricing 1: 1=1.2, 10=0.949, 100=0.7116, 500=0.53762 (USD); Mount: Surface Mount; Number of Pins: 2; Weight: 0.000564oz; Case Code (Metric): 3225; Case Code (Imperial): 1210; Min Operating Temperature: -55°C; Max Operating Temperature: 125°C; Capacitance: 10uF; Packaging: Tape and Reel; Package Quantity: 1; Voltage Rating (DC): 50V; Dielectric: X7S; Termination: SMD/SMT; Composition: Ceramic; Voltage: 50V; Length: 3.2mm; Height: 2.5mm; Width: 0.098inch; Thickness: 0.11inch; Depth: 2.5mm; Radiation Hardening: No; REACH SVHC: No SVHC; Lead Free: Lead Free; ComponentLink3URL: http://www.mouser.com/ds/2/400/lcc_commercial_general_en-837201.pdf; ComponentLink3Description: http://www.mouser.com/ds/2/400/lcc_commercial_general_en-837201.pdf; ComponentLink4URL: https://product.tdk.com/info/en/documents/chara_sheet/C3225X7S1H106M250AB.pdf; ComponentLink4Description: https://product.tdk.com/info/en/documents/chara_sheet/C3225X7S1H106M250AB.pdf; ComponentLink5URL: http://www.farnell.com/datasheets/1537205.pdf; ComponentLink5Description: http://www.farnell.com/datasheets/1537205.pdf; ComponentLink6URL: http://www.farnell.com/datasheets/1571323.pdf; ComponentLink6Description: http://www.farnell.com/datasheets/1571323.pdf; ComponentLink7URL: http://www.tdk.co.jp/tefe02/e412_c.pdf; ComponentLink7Description: http://www.tdk.co.jp/tefe02/e412_c.pdf; Stock 2: 0; Pricing 2: 1=0.79, 10=0.559, 100=0.3683 (USD); ComponentLink8URL: http://www.yuden.co.jp/ut/solutions/high_reliability/images/buy/E_HQE_capacitor.pdf; ComponentLink8Description: http://www.yuden.co.jp/ut/solutions/high_reliability/images/buy/E_HQE_capacitor.pdf; ComponentLink9URL: http://www.farnell.com/datasheets/1644644.pdf; ComponentLink9Description: http://www.farnell.com/datasheets/1644644.pdf; ComponentLink10URL: http://www.mouser.com/ds/2/396/mlcc_all_e-1149778.pdf; ComponentLink10Description: http://www.mouser.com/ds/2/396/mlcc_all_e-1149778.pdf; ComponentLink11URL: http://www.yuden.co.jp/ut/product/pdf_html/pdf/mlcc_all_e.pdf; ComponentLink11Description: http://www.yuden.co.jp/ut/product/pdf_html/pdf/mlcc_all_e.pdf; ComponentLink12URL: http://www.onlinecomponents.com/productFiles/mf-TAI/mlcc01_e.pdf; ComponentLink12Description: http://www.onlinecomponents.com/productFiles/mf-TAI/mlcc01_e.pdf; ComponentLink13URL: http://www.farnell.com/datasheets/746258.pdf; ComponentLink13Description: http://www.farnell.com/datasheets/746258.pdf; .SCHCHK: USED; Supplier 1: Digi-Key; Supplier Part Number 1: 445-4537-6-ND
footprint C-1210
pins: 1, 2

## C-10UF-2220
designator C?, comment 10UF  Voltage Rating: 100V  Case/Package: 2220
CAP CER 10UF 100V X7R 2220; Manufacturer: Kyocera AVX; Manufacturer Part Number: 22201C106MAT2A; Tolerance: 20%; .PCBCHK: USED; .Creator: M.OZKAN; Washability: OK; Supplier 1: Digi-Key; Supplier Part Number 1: 478-9622-6-ND; Stock 1: 0; Pricing 1: 1=2.58, 10=2.087, 100=1.5939 (USD); Mount: Surface Mount; Case Code (Metric): 5750; Min Operating Temperature: -55°C; Max Operating Temperature: 125°C; Packaging: Tape and Reel; Dielectric: X7R; Voltage Rating (DC): 100V; Length: 0.224inch; Width: 0.197inch; Thickness: 0.11inch; Capacitance: 10uF; Case Code (Imperial): 2220; .SCHCHK: USED
footprint C-2220
pins: 1, 2

## C-10UF-TH
designator C?, comment 10UF  Case/Package: Radial  Voltage Rating: 50V
CAP ALUM 10UF 20% 50V RADIAL; Manufacturer: Rubycon; Manufacturer Part Number: 50ML10MEFCTZ5X7; Ripple Current: 30mA; Life (Hours): 5000Hour; .Creator: M.OZKAN; .PCBCHK: USED; Washability: OK; Supplier 1: Digikey; Stock 1: 3979; Pricing 1: 1=0.26, 10=0.181, 100=0.1024, 500=0.07232, 1000=0.06327, 2500=0.06026 (USD); Mount: Through Hole; Min Operating Temperature: -40°C; Max Operating Temperature: 105°C; Package Quantity: 5000; Capacitance: 10uF; Packaging: Tape and Reel; Tolerance: 20%; Lead Pitch: 0.079inch; Height - Seated (Max): 0.315inch; ComponentLink1URL: http://www.rubycon.co.jp/en/catalog/e_pdfs/aluminum/e_ml.pdf; ComponentLink1Description: http://www.rubycon.co.jp/en/catalog/e_pdfs/aluminum/e_ml.pdf; Supplier Part Number 1: 1189-4211-1-ND; .SCHCHK: USED
pins: 1, 2
text: +

## C-12PF-0402
designator C?, comment 12PF  Voltage Rating (DC): 50V  Case/Package: 0402
CAP CER 12PF 50V C0G/NPO 0402; Manufacturer: Samsung; Manufacturer Part Number: CL05C120JB5NNNC; Material: Ceramic; Tolerance: 5%; Dielectric: C0G; Temperature Coefficient: 300ppm/°C; Supplier 1: Digi-Key; Supplier Part Number 1: 1276-1178-1-ND; Stock: 2522419; Pricing: 1=0.1, 10=0.022, 50=0.0118, 100=0.0097, 500=0.0069, 1000=0.0055, 2500=0.005, 5000=0.0046 (USD); RoHS: Yes; Mount: Surface Mount; Case Code (Metric): 1005; Case Code (Imperial): 0402; Contact Plating: Tin; Min Operating Temperature: -55°C; Max Operating Temperature: 125°C; Capacitance: 12pF; Package Quantity: 1; Packaging: Tape and Reel; Voltage Rating: 50V; Voltage: 50V; Length: 1mm; Height: 0.5mm; Width: 0.02inch; Thickness: 0.022inch; Depth: 0.5mm; Radiation Hardening: No; Lead Free: Lead Free; ComponentLink1URL: https://datasheet.ciiva.com/25806/cl05c120jb5nnnc-25806484.pdf?src-supplier=Digi-Key; ComponentLink1Description: https://datasheet.ciiva.com/25806/cl05c120jb5nnnc-25806484.pdf?src-supplier=Digi-Key; ComponentLink2URL: https://datasheet.ciiva.com/26838/getdatasheetpartid-658047-26838280.pdf?src-supplier=Verical; ComponentLink2Description: https://datasheet.ciiva.com/26838/getdatasheetpartid-658047-26838280.pdf?src-supplier=Verical; ComponentLink3URL: https://datasheet.ciiva.com/29198/458703-da-01-en-vs-kondensator-0402-29198421.pdf?src-supplier=Conrad; ComponentLink3Description: https://datasheet.ciiva.com/29198/458703-da-01-en-vs-kondensator-0402-29198421.pdf?src-supplier=Conrad; ComponentLink4URL: https://datasheet.ciiva.com/16449/cl05b104kq5nnnc-16449055.pdf?src-supplier=Future+Electronics; ComponentLink4Description: https://datasheet.ciiva.com/16449/cl05b104kq5nnnc-16449055.pdf?src-supplier=Future+Electronics
footprint C-0402
pins: 1, 2

## C-12PF-0603
designator C?, comment 12PF  Voltage: 50V  Case Code (Imperial): 0603
CAP CER 12PF 50V C0G/NP0 0603; Manufacturer: Samsung; Manufacturer Part Number: CL10C120JB8NNNC; Material: Ceramic; Tolerance: 5%; Dielectric: C0G; Temperature Coefficient: 300ppm/°C; .Creator: M.OZKAN; .PCBCHK: USED; Washability: OK; Supplier 1: Digi-Key; Stock 1: 259919; Pricing 1: 1=0.1, 10=0.07, 100=0.0314, 500=0.0224, 1000=0.0176 (USD); Mount: Surface Mount; Case/Package: 0603; Case Code (Metric): 1608; Contact Plating: Tin; Min Operating Temperature: -55°C; Max Operating Temperature: 125°C; Capacitance: 12pF; Voltage Rating (DC): 50V; Voltage Rating: 50V; Package Quantity: 1; Packaging: Tape and Reel; Length: 1.6mm; Height: 0.8mm; Depth: 0.8mm; Width: 0.031inch; Thickness: 0.035inch; Radiation Hardening: No; Lead Free: Lead Free; ComponentLink1URL: https://media.digikey.com/pdf/Data%20Sheets/Samsung%20PDFs/CL_Series_MLCC_ds.pdf; ComponentLink1Description: https://media.digikey.com/pdf/Data%20Sheets/Samsung%20PDFs/CL_Series_MLCC_ds.pdf; ComponentLink2URL: https://www.verical.com/server-webapp/html/getDatasheet?partID=640658; ComponentLink2Description: https://www.verical.com/server-webapp/html/getDatasheet?partID=640658; ComponentLink3URL: https://produktinfo.conrad.com/datenblaetter/450000-474999/457317-da-01-en-VS_KONDENSATOR_0603.pdf; ComponentLink3Description: https://produktinfo.conrad.com/datenblaetter/450000-474999/457317-da-01-en-VS_KONDENSATOR_0603.pdf; Supplier Part Number 1: 1276-1254-6-ND; .SCHCHK: USED
footprint C-0603
pins: 1, 2

## C-18PF-0402
designator C?, comment 18PF  Voltage Rating: 50V  Case/Package: 0402
CAP CER 18PF 50V C0G/NP0 0402; Manufacturer: Murata; Manufacturer Part Number: GRM1555C1H180JA01D; Material: Ceramic; Tolerance: 5%; Dielectric: C0G; Temperature Coefficient: 30ppm/°C; .Creator: M.OZKAN; .PCBCHK: USED; Washability: OK; Supplier 1: Digi-Key; Stock 1: 9943654; Pricing 1: 1 = 0.10000, 10 = 0.03500, 100 = 0.01580, 500 = 0.01128, 1000 = 0.00886, 2500 = 0.00805, 5000 = 0.00741 (USD); RoHS: Yes; Mount: Surface Mount; Number of Pins: 2; Case Code (Metric): 1005; Case Code (Imperial): 0402; Min Operating Temperature: -55°C; Max Operating Temperature: 125°C; Capacitance: 18pF; Packaging: Tape and Reel; Package Quantity: 1; Voltage Rating (DC): 50V; Termination: SMD/SMT; Voltage: 50V; Length: 1mm; Height: 0.5mm; Width: 0.02inch; Thickness: 0.022inch; Depth: 0.5mm; Radiation Hardening: No; REACH SVHC: No SVHC; Lead Free: Lead Free; ComponentLink1URL: http://www.farnell.com/datasheets/2048727.pdf?src-supplier=Farnell; ComponentLink1Description: http://www.farnell.com/datasheets/2048727.pdf?src-supplier=Farnell; ComponentLink2URL: https://www.murata.com/~/media/webrenewal/support/library/catalog/products/capacitor/mlcc/c02e.ashx?la=en-us&src-supplier=Digi-Key; ComponentLink2Description: https://www.murata.com/~/media/webrenewal/support/library/catalog/products/capacitor/mlcc/c02e.ashx?la=en-us&src-supplier=Digi-Key; ComponentLink3URL: http://www.farnell.com/datasheets/2048727.pdf?src-supplier=Mouser; ComponentLink3Description: http://www.farnell.com/datasheets/2048727.pdf?src-supplier=Mouser; ComponentLink4URL: http://www.farnell.com/datasheets/1747440.pdf?src-supplier=Element14; ComponentLink4Description: http://www.farnell.com/datasheets/1747440.pdf?src-supplier=Element14; ComponentLink5URL: https://www.verical.com/server-webapp/html/getDatasheet?partID=316062&src-supplier=Verical; ComponentLink5Description: https://www.verical.com/server-webapp/html/getDatasheet?partID=316062&src-supplier=Verical; ComponentLink6URL: https://produktinfo.conrad.com/datenblaetter/450000-474999/453634-da-01-en-VS_KONDENSATOR_0402.pdf?src-supplier=Conrad; ComponentLink6Description: https://produktinfo.conrad.com/datenblaetter/450000-474999/453634-da-01-en-VS_KONDENSATOR_0402.pdf?src-supplier=Conrad; Supplier Part Number 1: 490-5858-1-ND; .SCHCHK: USED
footprint C-0402
pins: 1, 2

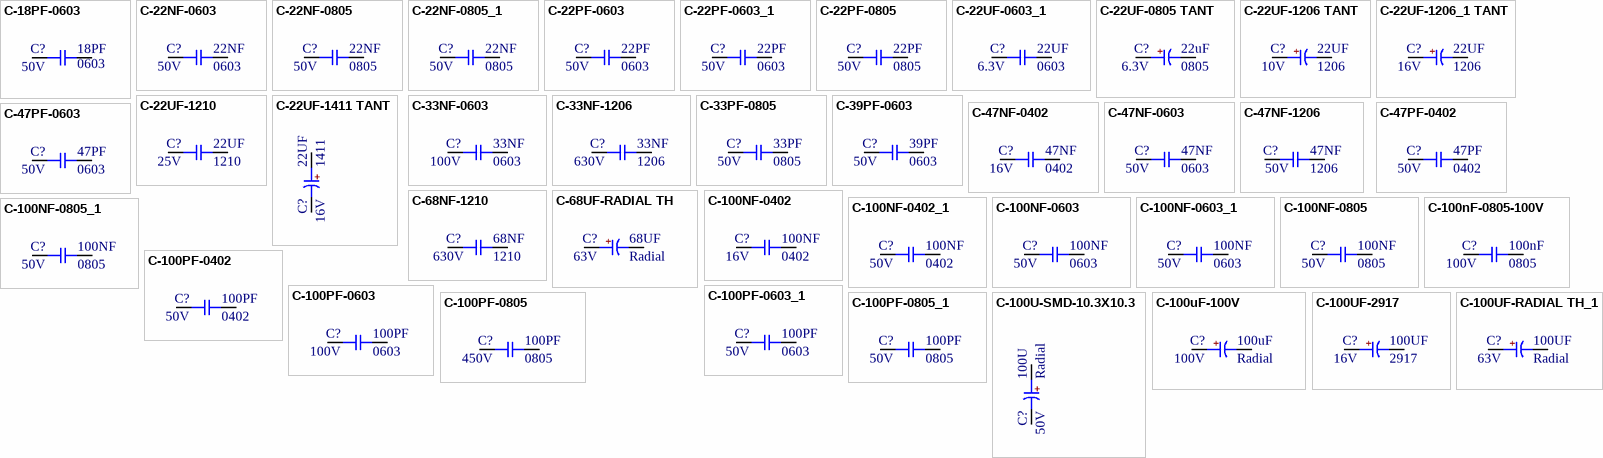
[diagram p2: symbols C-18PF-0603 to C-100UF-RADIAL TH_1]

## C-18PF-0603
designator C?, comment 18PF  Voltage Rating: 50V  Case Code (Imperial): 0603